# Altium footprint library Footprints_SOC.PcbLib: 197 footprints (part 10 of 13)
Each footprint in its own frame and in the unit in brackets; x right, y up, seen from the top. Pads: shape width x height; smd on the part's side, far side on the other; paste and mask are expansions set on the pad; w line width, h text height; cw(c..) or ccw(c..) is an arc to the next point about the centre after c.
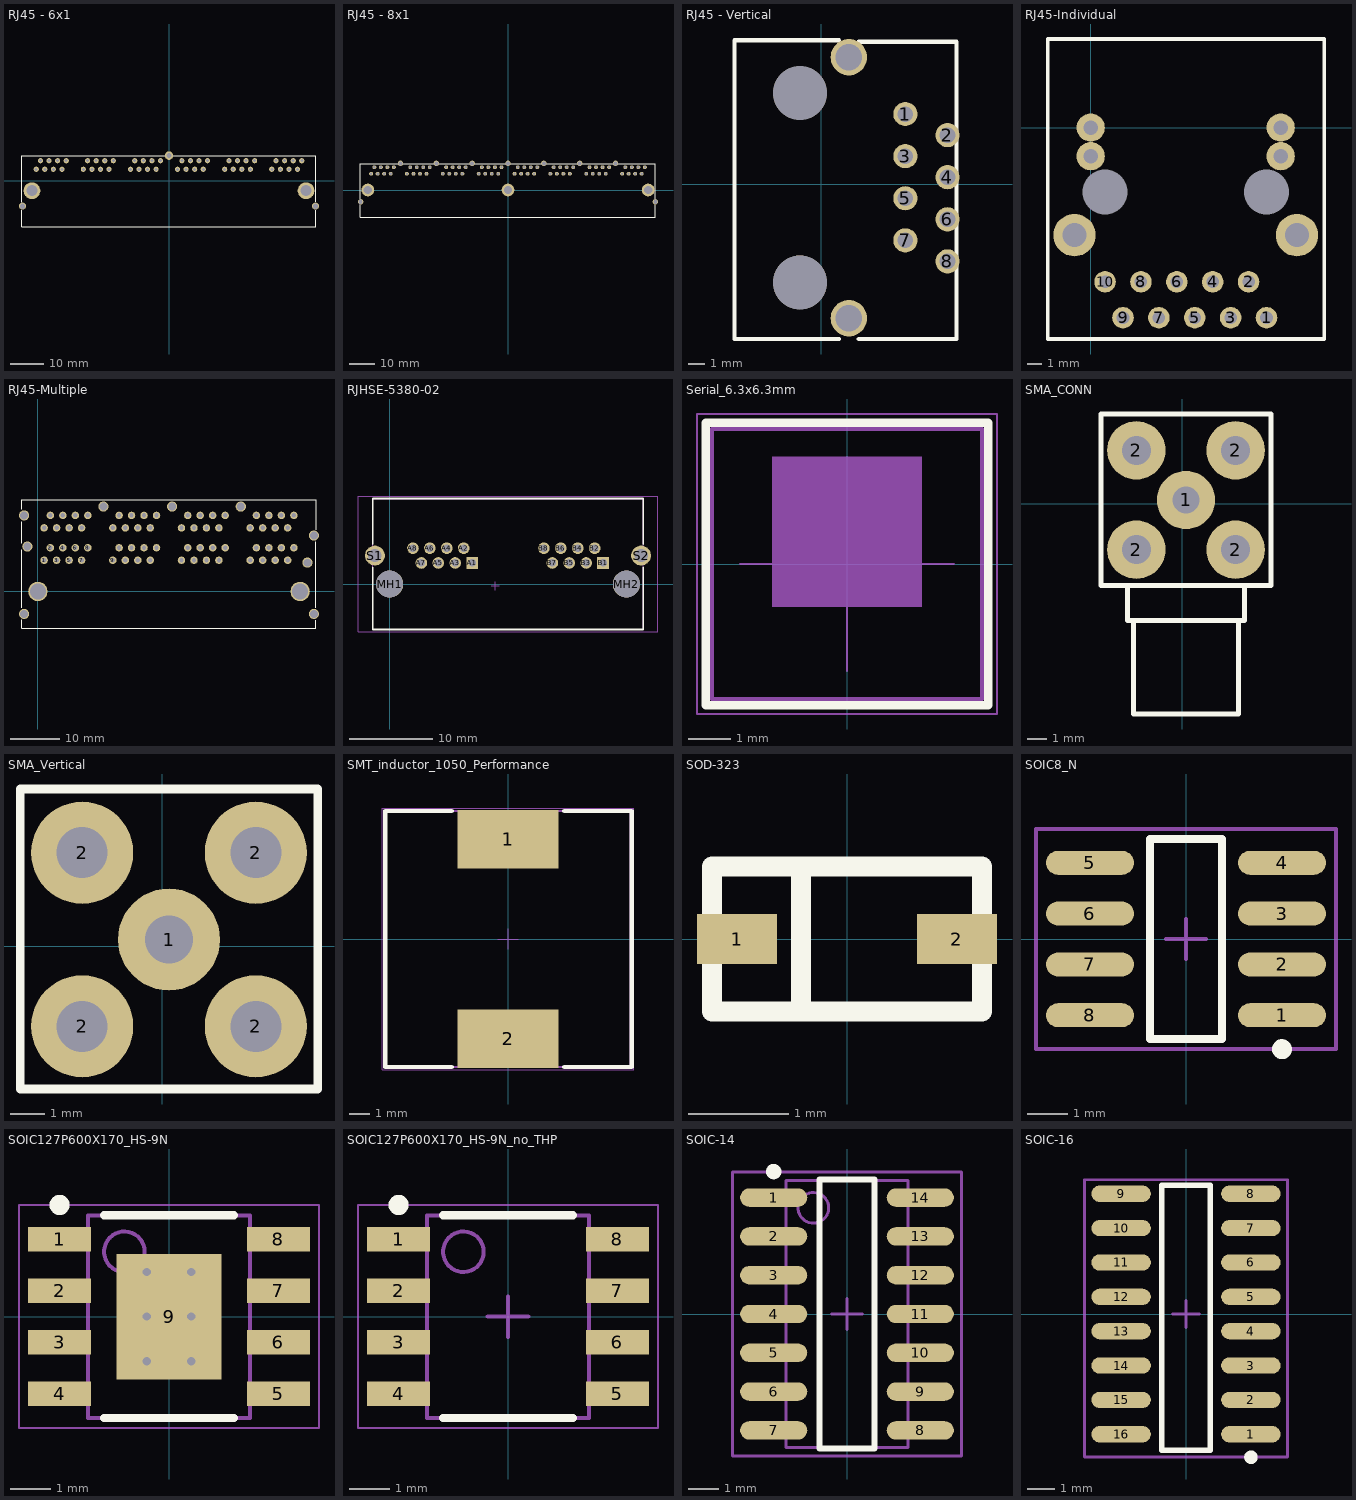
[diagram p9: the footprints below, top view; thin cyan lines are the x and y axes]

## RJ45 - 6x1 [mil] "6 conectores RJ-45 P/N: 5558525-1"
height 1062.99
pads (53):
  round 60 hole 35: 1(-1550,135.08) 2(-1500,235.08) 3(-1450,135.08) 4(-1400,235.08) 5(-1350,135.08) 6(-1300,235.08) 7(-1250,135.08) 8(-1200,235.08) 9(-1000,135.08) 10(-950,235.08) 11(-900,135.08) 12(-850,235.08) 13(-800,135.08) 14(-750,235.08) 15(-700,135.08) 16(-650,235.08) 17(-450,135.08) 18(-400,235.08) 19(-350,135.08) 20(-300,235.08) 21(-250,135.08) 22(-200,235.08) 23(-150,135.08) 24(-100,235.08) 25(100,135.08) 26(150,235.08) 27(200,135.08) 28(250,235.08) 29(300,135.08) 30(350,235.08) 31(400,135.08) 32(450,235.08) 34(700,235.08) 35(750,135.08) 36(800,235.08) 37(850,135.08) 38(900,235.08) 39(950,135.08) 40(1000,235.08) 41(1200,135.08) 42(1250,235.08) 43(1300,135.08) 44(1350,235.08) 45(1400,135.08) 46(1450,235.08) 47(1500,135.08) 48(1550,235.08)
  round 60 hole 35 paste+0: 33(650,135.08)
  round 82 hole 62: ""(-1710,-294.92) ""(1710,-294.92)
  round 196.85 hole 129: ""(-1600,-114.92) ""(1600,-114.92)
  round 98.43 hole 62: ""(0,294.92)
Top Overlay:
  lines w10: -1716.54,-342.92 -1716.54,-534.21 1712.99,-534.21 1712.99,-343.92 ; -1716.54,-246.92 -1716.54,290.2 1714.81,290.2 1714.81,-245.92
3D body "rj-45 6x1 5558525-1.stp": height 586.59, standoff -147.91, extent -1714.79,-539.9 1714.81,300.1

## RJ45 - 8x1 [mil] "8 conectores RJ-45"
height 1062.99
pads (76):
  round 60 hole 35: 1(-2100,250) 2(-2050,350) 3(-2000,250) 4(-1950,350) 5(-1900,250) 6(-1850,350) 7(-1800,250) 8(-1750,350) 9(-1550,250) 10(-1500,350) 11(-1450,250) 12(-1400,350) 13(-1350,250) 14(-1300,350) 15(-1250,250) 16(-1200,350) 17(-1000,250) 18(-950,350) 19(-900,250) 20(-850,350) 21(-800,250) 22(-750,350) 23(-700,250) 24(-650,350) 25(-450,250) 26(-400,350) 27(-350,250) 28(-300,350) 29(-250,250) 30(-200,350) 31(-150,250) 32(-100,350) 34(150,350) 35(200,250) 36(250,350) 37(300,250) 38(350,350) 39(400,250) 40(450,350) 41(650,250) 42(700,350) 43(750,250) 44(800,350) 45(850,250) 46(900,350) 47(950,250) 48(1000,350) 49(1200,250) 50(1250,350) 51(1300,250) 52(1350,350) 53(1400,250) 54(1450,350) 55(1500,250) 56(1550,350) 57(1750,250) 58(1800,350) 59(1850,250) 60(1900,350) 61(1950,250) 62(2000,350) 63(2050,250) 64(2100,350)
  round 60 hole 35 paste+0: 33(100,250)
  round 82 hole 62: ""(-2260,-180) ""(-1650,409.84) ""(-1100,409.84) ""(-550,409.84) ""(0,409.84) ""(550,409.84) ""(1100,409.84) ""(1650,409.84) ""(2259.84,-180)
  round 196.85 hole 129: ""(-2150,0) ""(0,0) ""(2150,0)
Top Overlay:
  lines w10: -2266.54,-228 -2266.54,-419.29 2259.84,-419.29 2259.84,-229 ; -2266.54,-132 -2266.54,405.12 2259.84,405.12 2259.84,-131
3D body "rj-45 8x1.stp": height 531.59, standoff -135.41, extent -2251.18,-413.54 2248.82,396.46

## RJ45 - Vertical [mil] "1 conector RJ-45 Through Hole TE Connectivty (100616-2)"
height 1062.99
pads (12):
  round 57.4 hole 37 mask+0: 1(199.76,166.5) 2(299.76,116.5) 3(199.76,66.5) 4(299.76,16.5) 5(199.76,-33.5) 6(299.76,-83.5) 7(199.76,-133.5) 8(299.76,-183.5)
  round 128 hole 128 unplated: ""(-50.63,-233.5) ""(-50.63,216.5)
  round 86.61 hole 63: ""(65.51,-318.5) ""(65.51,301.5)
Top Overlay:
  lines w10: 42.11,-367.83 -206.3,-367.83 -206.3,342.01 42.11,342.01 ; 88.91,-367.83 321.26,-367.83 321.26,338.03 88.91,338.03
3D body "RJ-45 modulo vertical through hole (100616-2).stp": height 629.92, standoff -151.57, extent -206.3,-368.06 321.26,340.6

## RJ45-Individual [mm] "Wurth Elektronik"
height 27
pads (18):
  round 1.524 hole 0.889: 1(12.445,-13.46) 2(11.175,-10.92) 3(9.905,-13.46) 4(8.635,-10.92) 5(7.365,-13.46) 6(6.095,-10.92) 7(4.825,-13.46) 8(3.555,-10.92) 9(2.285,-13.46) 10(1.015,-10.92)
  round 3 hole 1.7: ""(-1.15,-7.62) ""(14.6,-7.62)
  round 2 hole 1.02: ""(0,-2.03) ""(0,0) ""(13.45,-2.03) ""(13.45,0)
  round 3 hole 3.2: ""(1.01,-4.57) ""(12.44,-4.57)
Top Overlay:
  lines w0.254: -3.03,-14.97 16.52,-14.97 16.52,6.27 -3.03,6.27 -3.03,-14.97
3D body "RJ-45 Wurth Elektronik.stp": height 15.5, standoff -2.82, extent -2.974,-14.99 16.474,6.31

## RJ45-Multiple [mil] "8 Channel CAT5 Connector"
height 1062.99
pads (75):
  round 60 hole 35: 1(50,250) 2(100,350) 3(150,250) 4(200,350) 5(250,250) 6(300,350) 7(350,250) 8(400,350) 9(600,250) 10(650,350) 11(700,250) 12(750,350) 13(800,250) 14(850,350) 15(900,250) 16(950,350) 17(1150,250) 18(1200,350) 19(1250,250) 20(1300,350) 21(1350,250) 22(1400,350) 23(1450,250) 24(1500,350) 25(1700,250) 26(1750,350) 27(1800,250) 28(1850,350) 29(1900,250) 30(1950,350) 31(2000,250) 32(2050,350) 33(2050,609) 34(2000,509) 35(1950,609) 36(1900,509) 37(1850,609) 38(1800,509) 39(1750,609) 40(1700,509) 41(1500,609) 42(1450,509) 43(1400,609) 44(1350,509) 45(1300,609) 46(1250,509) 47(1200,609) 48(1150,509) 49(950,609) 50(900,509) 51(850,609) 52(800,509) 53(750,609) 54(700,509) 55(650,609) 56(600,509) 57(400,609) 58(350,509) 59(300,609) 60(250,509) 61(200,609) 62(150,509) 63(100,609) 64(50,509)
  round 82 hole 62: ""(-110,-180) ""(-110,609) ""(-84,360) ""(525,680) ""(1075,680) ""(1625,680) ""(2158,231) ""(2210,-180) ""(2210,448)
  round 155 hole 129: ""(0,0) ""(2100,0)
Top Overlay:
  lines w10: -128,-228 -128,-295 2226,-295 2226,-229 ; -128,-132 -128,333 ; -128,657 -128,735 2228,735 2228,496 ; -127,388 -127,560 ; 2226,-131 2226,400
3D body "70042890.stp": height 1037.5, standoff -157.3, extent -165,-415 2245,705

## RJHSE-5380-02 [mm] "Modular Jack Horizontal Shielded Dual Port 8P8C Tab Up"
height 13.75
pads (20):
  rect 1.4x1.4 hole 0.9: A1(9.906,2.54) B1(25.654,2.54)
  round 1.4 hole 0.9: A2(8.89,4.318) A3(7.874,2.54) A4(6.858,4.318) A5(5.842,2.54) A6(4.826,4.318) A7(3.81,2.54) A8(2.794,4.318) B2(24.638,4.318) B3(23.622,2.54) B4(22.606,4.318) B5(21.59,2.54) B6(20.574,4.318) B7(19.558,2.54) B8(18.542,4.318)
  round 3.25 hole 3.25 unplated: MH1(0,0) MH2(28.448,0)
  round 2.4 hole 1.6: S1(-1.778,3.429) S2(30.226,3.429)
Top Overlay:
  lines w0.203: -2.032,2.032 -2.032,-5.461 30.48,-5.461 30.48,2.032 ; -2.032,4.826 -2.032,10.287 30.48,10.287 30.48,4.826
Mechanical 5:
  lines w0.1: -2.032,-5.461 -2.032,10.287 30.48,10.287 30.48,-5.461 -2.032,-5.461
  text ".Designator" at 12.7,-0.215 h1.02
Mechanical 15:
  lines w0.05: 12.2,-0.215 13.2,-0.215 ; 12.7,-0.715 12.7,0.285 ; -3.81,-5.715 -3.81,10.541 32.258,10.541 32.258,-5.715 -3.81,-5.715
3D body "RJHSE-5380-02-REVT1.step": height 15.06, standoff -3.78, extent -3.503,-5.41 31.951,10.287

## Serial_6.3x6.3mm [mm]
Top Overlay:
  lines w0.2: -3.3,-3.3 -3.3,3.3 3.3,3.3 3.3,-3.3 -3.3,-3.3
Mechanical 5:
  region: -1.75,2.5 -1.75,-1 1.75,-1 1.75,2.5
  lines w0.1: -3.15,-3.15 3.15,-3.15 3.15,3.15 -3.15,3.15 -3.15,-3.15
  text "SerialNr" at 2.5,-1.7 h0.7
Mechanical 15:
  lines w0.05: -2.5,0 2.5,0 ; 0,-2.5 0,2.5 ; -3.5,-3.5 -3.5,3.5 3.5,3.5 3.5,-3.5 -3.5,-3.5

## SMA_CONN [mm]
pads (5):
  round 3 hole 1.4: 1(0.2,0.2)
  round 3 hole 1.5: 2(-2.35,-2.35) 2(-2.35,2.75) 2(2.75,-2.35) 2(2.75,2.75)
Top Overlay:
  lines w0.254: -2.8,-4.21 -2.8,-6 ; -2.5,-6 -2.5,-10.8 2.9,-10.8 2.9,-6 ; 3.2,-4.21 3.2,-6 -2.8,-6 ; -2.8,-6 -2.8,-6 ; -4.17,-4.19 4.57,-4.19 4.57,4.62 -4.17,4.62 -4.17,-4.19
3D body "SMA.stp": height 11.18, standoff -2.66, extent -3,-10.75 3.35,3.45

## SMA_Vertical [mm]
pads (5):
  round 3 hole 1.4: 1(0.2,0.2)
  round 3 hole 1.5: 2(-2.35,-2.35) 2(-2.35,2.75) 2(2.75,-2.35) 2(2.75,2.75)
Top Overlay:
  lines w0.254: -4.17,-4.19 4.57,-4.19 4.57,4.62 -4.17,4.62 -4.17,-4.19
3D body "SMA vertical.step": height 9.72, standoff -3.81, extent -2.975,-2.975 3.375,3.375

## SMT_inductor_1050_Performance [mm] "SMD Shielded Power Inductor, 2-leads, body 10.3x10.5mm"
height 5
pads (2):
  rect 5x2.9 smd: 1(0,4.95) 2(0,-4.95)
Top Overlay:
  lines w0.2: -2.794,-6.35 -6.096,-6.35 -6.096,6.35 -2.794,6.35 ; 2.794,-6.35 6.147,-6.35 6.147,6.35 2.794,6.35
Mechanical 5:
  lines w0.1: -6.096,-6.35 -6.096,6.35 6.096,6.35 6.096,-6.35 -6.096,-6.35
  text ".Designator" at 0,0 h1.02
Mechanical 15:
  lines w0.05: -0.5,0 0.5,0 ; 0,-0.5 0,0.5 ; -6.25,-6.5 -6.25,6.5 6.25,6.5 6.25,-6.5 -6.25,-6.5
3D body "Coilcraft-MSS1210.STEP": height 10.16, standoff -0.04, extent -6.15,-6.15 6.15,6.15

## SOD-323 [mm]
pads (2):
  rect 0.8x0.5 smd: 1(-1.1,0) 2(1.1,0)
Top Overlay:
  lines w0.2: -0.46,-0.725 -0.46,0.725 ; -1.35,-0.725 -1.35,0.725 1.35,0.725 1.35,-0.725 -1.35,-0.725
3D body "SC-76.stp": height 1.1, standoff 0, extent -1.35,-0.725 1.35,0.725

## SOIC8_N [mm] "SOIC, 8-Leads, Body 4.9x3.9mm, Pitch 1.27mm, IPC Medium Density"
height 1.75
pads (8):
  oval 2.2x0.6 smd: 1(2.4,-1.905) 2(2.4,-0.635) 3(2.4,0.635) 4(2.4,1.905) 5(-2.4,1.905) 6(-2.4,0.635) 7(-2.4,-0.635) 8(-2.4,-1.905)
Top Overlay:
  circle w0.25: c2.4,-2.755 r0.125
  lines w0.2: -0.9,-2.5 -0.9,2.5 0.9,2.5 0.9,-2.5 -0.9,-2.5
Mechanical 15:
  lines w0.1: -0.5,0 0.5,0 ; 0,-0.5 0,0.5 ; -3.75,-2.75 -3.75,2.75 3.75,2.75 3.75,-2.75 -3.75,-2.75
3D body "D8-M.step": height 1.76, standoff 0, extent -3.099,-2.502 3.099,2.502

## SOIC127P600X170_HS-9N [mm] "SOIC, 8-Leads, Body 4,90x3,90mm, Pitch 1,27mm, Thermal Pad 3,10x2,60mm, IPC Medium Density"
height 1.7
pads (9):
  rect 1.55x0.6 smd: 1(-2.7,1.905) 2(-2.7,0.635) 3(-2.7,-0.635) 4(-2.7,-1.905) 5(2.7,-1.905) 6(2.7,-0.635) 7(2.7,0.635) 8(2.7,1.905)
  rect 2.6x3.1 smd: 9(0,0)
via 0.55,-1.1 diameter 0.5 hole 0.2
via -0.55,-1.1 diameter 0.5 hole 0.2
via 0.55,0 diameter 0.5 hole 0.2
via -0.55,0 diameter 0.5 hole 0.2
via 0.55,1.1 diameter 0.5 hole 0.2
via -0.55,1.1 diameter 0.5 hole 0.2
Top Overlay:
  circle w0.25: c-2.7,2.755 r0.125
  lines w0.2: -1.6,-2.5 1.6,-2.5 ; -1.6,2.5 1.6,2.5
Mechanical 5:
  circle w0.1: c-1.1,1.6 r0.5
  lines w0.1: -2,-2.5 2,-2.5 2,2.5 -2,2.5 -2,-2.5
  text ".Designator" at 0,2.032 h1.52
Mechanical 15:
  lines w0.05: -3.7,-2.75 3.7,-2.75 3.7,2.75 -3.7,2.75 -3.7,-2.75
  lines w0.1: -0.5,0 0.5,0 ; 0,-0.5 0,0.5
3D body "User Library-SOIC-8-1.STEP": height 1.75, standoff 0, extent -3,-2.45 3,2.45

## SOIC127P600X170_HS-9N_no_THP [mm] "SOIC, 8-Leads, Body 4,90x3,90mm, Pitch 1,27mm, Thermal Pad 3,10x2,60mm, IPC Medium Density"
height 1.7
pads (8):
  rect 1.55x0.6 smd: 1(-2.7,1.905) 2(-2.7,0.635) 3(-2.7,-0.635) 4(-2.7,-1.905) 5(2.7,-1.905) 6(2.7,-0.635) 7(2.7,0.635) 8(2.7,1.905)
Top Overlay:
  circle w0.25: c-2.7,2.755 r0.125
  lines w0.2: -1.6,-2.5 1.6,-2.5 ; -1.6,2.5 1.6,2.5
Mechanical 5:
  circle w0.1: c-1.1,1.6 r0.5
  lines w0.1: -2,-2.5 2,-2.5 2,2.5 -2,2.5 -2,-2.5
  text ".Designator" at -1.016,2.032 h1.52
Mechanical 15:
  lines w0.05: -3.7,-2.75 -3.7,2.75 3.7,2.75 3.7,-2.75 -3.7,-2.75
  lines w0.1: -0.5,0 0.5,0 ; 0,-0.5 0,0.5
3D body "User Library-SOIC-8-1.STEP": height 1.75, standoff 0, extent -2.987,-2.463 3.013,2.437

## SOIC-14 [mm] "SOIC, 14-Leads, Body 8.7x3.9mm, Pitch 1.27mm, IPC Medium Density"
height 1.75
pads (14):
  oval 2.2x0.6 smd: 1(-2.4,3.81) 2(-2.4,2.54) 3(-2.4,1.27) 4(-2.4,0) 5(-2.4,-1.27) 6(-2.4,-2.54) 7(-2.4,-3.81) 8(2.4,-3.81) 9(2.4,-2.54) 10(2.4,-1.27) 11(2.4,0) 12(2.4,1.27) 13(2.4,2.54) 14(2.4,3.81)
Top Overlay:
  circle w0.25: c-2.4,4.66 r0.125
  lines w0.2: -0.9,-4.4 -0.9,4.4 0.9,4.4 0.9,-4.4 -0.9,-4.4
Mechanical 13:
  circle w0.1: c-1.1,3.475 r0.5
  lines w0.1: -2,-4.375 -2,4.375 2,4.375 2,-4.375 -2,-4.375
Mechanical 15:
  lines w0.1: -0.5,0 0.5,0 ; 0,-0.5 0,0.5 ; -3.75,-4.65 -3.75,4.65 3.75,4.65 3.75,-4.65 -3.75,-4.65
3D body "Package, SOIC-14, 3.9mm.STEP": height 1.5, standoff 0, extent -3,-4.475 3,4.475

## SOIC-16 [mm]
height 1.75
pads (16):
  oval 2.2x0.6 smd: 1(2.4,-4.445) 2(2.4,-3.175) 3(2.4,-1.905) 4(2.4,-0.635) 5(2.4,0.635) 6(2.4,1.905) 7(2.4,3.175) 8(2.4,4.445) 9(-2.4,4.445) 10(-2.4,3.175) 11(-2.4,1.905) 12(-2.4,0.635) 13(-2.4,-0.635) 14(-2.4,-1.905) 15(-2.4,-3.175) 16(-2.4,-4.445)
Top Overlay:
  circle w0.25: c2.4,-5.295 r0.125
  lines w0.2: -0.9,-5.04 -0.9,4.765 0.9,4.765 0.9,-5.04 -0.9,-5.04
Mechanical 15:
  lines w0.1: -0.5,0 0.5,0 ; 0,-0.5 0,0.5 ; -3.75,-5.29 -3.75,4.965 3.75,4.965 3.75,-5.29 -3.75,-5.29
3D body "D16-M.step": height 1.76, standoff 0, extent -3.099,-5.004 3.099,5.004